# Altium footprint library EXPLORER.PcbLib: 252 footprints (part 13 of 16)
Each footprint in its own frame and in the unit in brackets; x right, y up, seen from the top. Pads: shape width x height; smd on the part's side, far side on the other; paste and mask are expansions set on the pad; w line width, h text height; cw(c..) or ccw(c..) is an arc to the next point about the centre after c.
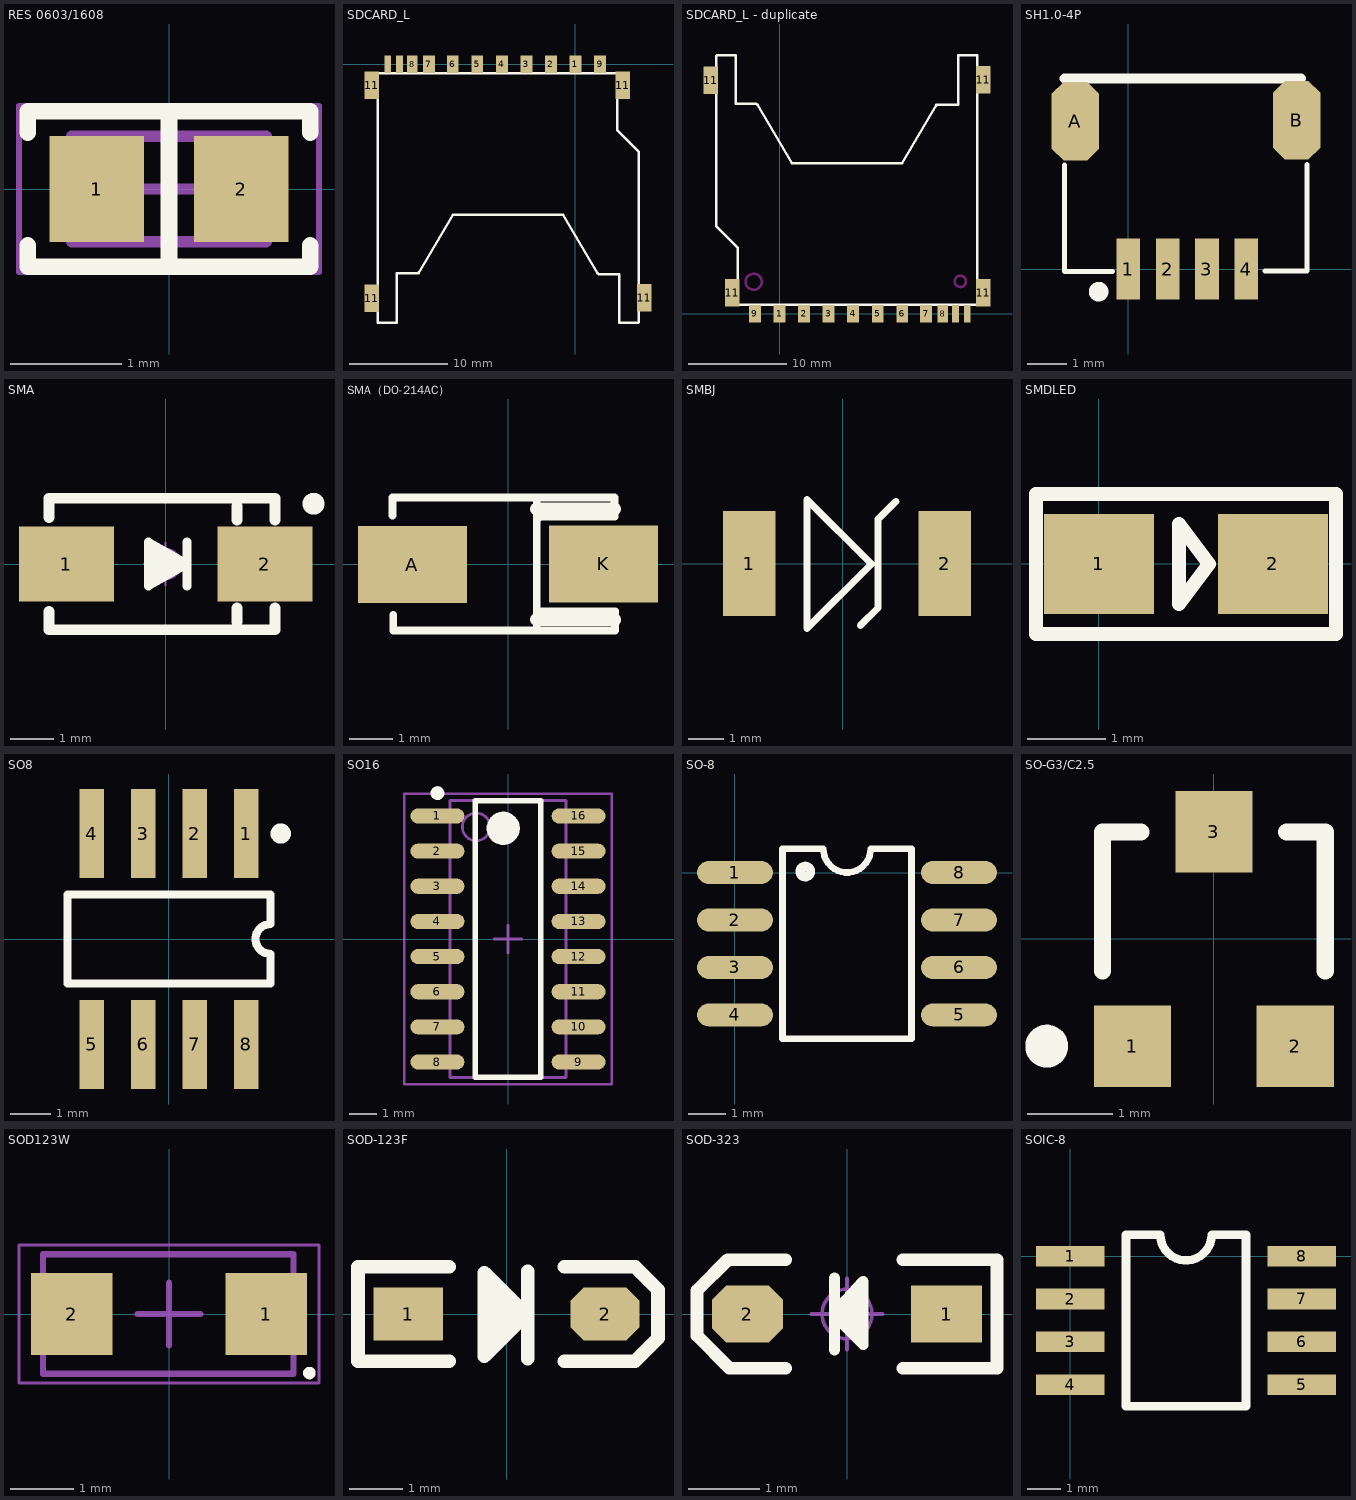
[diagram p12: the footprints below, top view; thin cyan lines are the x and y axes]

## RES 0603/1608 [mm]
pads (2):
  rect 0.85x0.95 smd: 1(-0.65,0) 2(0.65,0)
Top Overlay:
  lines w0.15: -1.27,-0.508 -1.27,-0.7 1.27,-0.7 1.27,-0.508 ; -1.27,0.508 -1.27,0.7 1.27,0.7 1.27,0.508 ; 0,-0.7 0,0.7
Mechanical 13:
  lines w0.1: -0.875,-0.475 0.875,-0.475 0.875,0.475 -0.875,0.475 -0.875,-0.475
Mechanical 15:
  lines w0.05: -1.35,-0.75 1.35,-0.75 1.35,0.75 -1.35,0.75 -1.35,-0.75
  lines w0.1: -0.475,0 0.475,0 ; 0,-0.475 0,0.475
3D body: height 0.45, standoff 0, extent -0.8,-0.4 0.8,0.4

## SDCARD_L [mm]
pads (15):
  rect 1.2x1.8 smd: 1(0,0) 2(-2.489,0) 3(-4.983,-0.009) 4(-7.483,-0.009) 5(-9.983,-0.009) 6(-12.483,-0.009) 7(-14.908,-0.009) 9(2.517,-0.009)
  rect 1.1x1.8 smd: 8(-16.612,0)
  rect 0.7x1.8 smd: 10(-17.908,-0.009) 12(-19.101,0)
  rect 1.5x2.8 smd: 11(-20.726,-23.834) 11(-20.726,-2.143) 11(4.826,-2.143) 11(7.01,-23.784)
Top Overlay:
  lines w0.254: -18.158,-21.3 -18.158,-26.3 -20.131,-26.3 -20.131,-0.914 -20.117,-0.9 4.242,-0.9 4.242,-6.71 6.431,-8.899 6.442,-8.899 6.442,-26.273 6.415,-26.3 4.442,-26.3 4.442,-21.402 2.4,-21.402 2.242,-21.244 ; -18.107,-21.294 -16.065,-21.294 -15.907,-21.136 ; -15.958,-21.294 -12.446,-15.3 ; -12.458,-15.3 -1.258,-15.3 2.242,-21.294

## SDCARD_L - duplicate [mm]
pads (15):
  rect 1.2x1.8 smd: 1(0,0) 2(2.489,0) 3(4.983,0.009) 4(7.483,0.009) 5(9.983,0.009) 6(12.483,0.009) 7(14.908,0.009) 9(-2.517,0.009)
  rect 1.1x1.8 smd: 8(16.612,0)
  rect 0.7x1.8 smd: 10(17.908,0.009) 12(19.101,0)
  rect 1.5x2.8 smd: 11(-7.01,23.784) 11(-4.826,2.143) 11(20.726,2.143) 11(20.726,23.834)
Top Overlay:
  lines w0.254: -2.242,21.244 -2.4,21.402 -4.442,21.402 -4.442,26.3 -6.415,26.3 -6.442,26.273 -6.442,8.899 -6.431,8.899 -4.242,6.71 -4.242,0.9 20.117,0.9 20.131,0.914 20.131,26.3 18.158,26.3 18.158,21.3 ; -2.242,21.294 1.258,15.3 12.458,15.3 ; 12.446,15.3 15.958,21.294 ; 15.907,21.136 16.065,21.294 18.107,21.294
Keep-Out Layer:
  circle w0.254: c-2.642,3.26 r0.82
  circle w0.254: c18.39,3.3 r0.58

## SH1.0-4P [mm]
pads (6):
  rect 0.6x1.55 smd: 1(0,0) 2(1,0) 3(2,0) 4(3,0)
  oct 1.2x2 smd: A(-1.346,3.759) B(4.279,3.785)
Top Overlay:
  circle w0.25: c-0.754,-0.573 r0.125
  lines w0.127: -1.626,2.653 -1.626,-0.065 -0.4,-0.065 ; 3.48,-0.051 4.547,-0.051 4.547,2.667
  lines w0.254: -1.626,4.851 4.394,4.851

## SMA [mm] "4.5x2.6*2.2mm（长宽高，不包括引脚）"
height 2.54
pads (2):
  rect 2.2x1.75 smd: 1(-2.3,0) 2(2.3,0)
Top Overlay:
  circle w0.254: c3.429,1.397 r0.127
  lines w0.203: 0.494,-0.508 0.494,0.508 ; -0.395,-0.508 -0.395,0.508 0.494,0 -0.395,-0.508
  lines w0.254: -2.7,-1.105 -2.7,-1.524 2.54,-1.524 2.54,-1.016 ; -2.7,1.08 -2.7,1.524 2.54,1.524 2.54,1.016 ; -0.33,0.305 0.305,0 -0.254,-0.305 -0.254,0.051 0.023,0 ; 1.651,-1.35 1.651,-1.016 ; 1.651,1.016 1.651,1.35
Mechanical 15:
  circle w0.05: c0,0 r0.35
  lines w0.05: -0.5,0 0.5,0 ; 0,-0.5 0,0.5
3D body: height 2.15, standoff 0.04, extent -2.528,-1.3 2.574,1.3

## SMA（DO-214AC） [mm] "贴"
height 2.3
pads (2):
  rect 2.5x1.778 smd: A(-2.193,-0.006) K(2.193,0.006)
Top Overlay:
  lines w0.178: -2.649,1.118 -2.649,1.53 2.447,1.53 2.447,1.118 ; -2.631,-1.161 -2.631,-1.518 2.454,-1.518 2.454,-1.105 ; 0.66,-1.493 0.66,1.524 ; 0.66,1.016 0.694,1.05 ; 0.694,-1.079 2.454,-1.079 ; 0.694,1.092 2.447,1.092
  lines w0.3: 0.66,-1.27 2.439,-1.27 2.447,-1.278 ; 0.66,1.27 2.439,1.27
3D body: height 2.4, standoff 0, extent -2.108,-1.499 2.489,1.524
3D body: height 1, standoff 0, extent 2.477,-0.483 2.997,0.508
3D body: height 1, standoff 0, extent -2.616,-0.508 -2.095,0.584
3D body: height 2.4, standoff 2.4, extent 1.549,-1.499 1.956,1.524

## SMBJ [mm]
pads (2):
  rect 1.5x3 smd: 1(-2.667,0) 2(2.921,0)
Top Overlay:
  lines w0.203: 0.508,-1.778 1.016,-1.27 1.016,1.27 1.524,1.778 ; -1.016,-1.854 -1.016,1.829 0.826,-0.013 -1.016,-1.854

## SMDLED [mm]
pads (2):
  rect 1.4x1.27 smd: 1(0.001,-0.002) 2(2.211,-0.002)
Top Overlay:
  lines w0.178: 3.012,0.887 3.011,0.887 ; 3.011,0.887 -0.799,0.887 -0.799,-0.002 -0.799,-0.891 3.011,-0.891 3.011,0.887 ; 1.017,-0.51 1.398,-0.002 1.017,0.506 1.017,-0.51

## SO8 [mm] "Small Outline; 8 Leads; Body Width 3.9 mm; Pitch 1.27 mm"
height 1.75
pads (8):
  rect 0.6x2.2 smd: 1(1.905,2.6) 2(0.635,2.6) 3(-0.635,2.6) 4(-1.905,2.6) 5(-1.905,-2.6) 6(-0.635,-2.6) 7(0.635,-2.6) 8(1.905,-2.6)
Top Overlay:
  circle w0.25: c2.755,2.6 r0.125
  lines w0.2: -2.5,-1.1 2.5,-1.1 2.5,-0.367 cw(c2.5,0) 2.5,0.367 2.5,1.1 -2.5,1.1 -2.5,-1.1

## SO16 [mm] "SOP, 16-Leads, Body 10.0x4.2mm (max), Pitch 1.27mm, IPC Medium Density"
height 2.65
pads (16):
  oval 1.95x0.55 smd: 1(-2.55,4.445) 2(-2.55,3.175) 3(-2.55,1.905) 4(-2.55,0.635) 5(-2.55,-0.635) 6(-2.55,-1.905) 7(-2.55,-3.175) 8(-2.55,-4.445) 9(2.55,-4.445) 10(2.55,-3.175) 11(2.55,-1.905) 12(2.55,-0.635) 13(2.55,0.635) 14(2.55,1.905) 15(2.55,3.175) 16(2.55,4.445)
Top Overlay:
  circle w0.6: c-0.175,4 r0.3
  circle w0.25: c-2.55,5.27 r0.125
  lines w0.2: -1.175,-5 1.175,-5 1.175,5 -1.175,5 -1.175,-5
Mechanical 13:
  circle w0.1: c-1.15,4.05 r0.5
  lines w0.1: -2.1,-5 2.1,-5 2.1,5 -2.1,5 -2.1,-5
Mechanical 15:
  lines w0.1: -0.5,0 0.5,0 ; 0,-0.5 0,0.5 ; -3.75,-5.25 3.75,-5.25 3.75,5.25 -3.75,5.25 -3.75,-5.25
3D body: height 2.65, standoff 0.1, extent -2.1,-5 2.1,5

## SO-8 [mil] "贴片"
height 60
pads (8):
  oval 80x24 smd: 1(0,0) 2(0,-50) 3(0,-100) 4(0,-150) 5(236,-150) 6(236,-100) 7(236,-50) 8(236,0)
Top Overlay:
  circle w10: c74,1 r5.39
  lines w7: 50,-175 50,25 93,25 ccw(c118,25) 143,25 186,25 186,-175 50,-175
3D body: height 50, standoff 0, extent 156.8,-158 196.2,7.08
3D body: height 50, standoff 0, extent 39.8,-157.08 79.2,8
3D body: height 69.84, standoff 30, extent 59.5,-177 176.51,-137.07
3D body: height 69.84, standoff 30, extent 59.49,-12.93 176.5,27
3D body: height 69.84, standoff 30, extent 39.63,-156.92 79.55,7.08
3D body: height 70, standoff 30, extent 39.62,-12.83 79.41,27
3D body: height 29.96, standoff 20, extent 204.76,-8 214.74,8
3D body: height 30, standoff 20, extent 196.2,-8 209.75,8
3D body: height 25, standoff 0, extent 204.7,-8 214.7,8
3D body: height 10, standoff 0, extent 209.75,-8 236,8
3D body: height 29.96, standoff 20, extent 204.76,-58 214.74,-42
3D body: height 30, standoff 20, extent 196.2,-58 209.75,-42
3D body: height 25, standoff 0, extent 204.7,-58 214.7,-42
3D body: height 10, standoff 0, extent 209.75,-58 236,-42
3D body: height 29.96, standoff 20, extent 204.76,-108 214.74,-92
3D body: height 30, standoff 20, extent 196.2,-108 209.75,-92
3D body: height 25, standoff 0, extent 204.7,-108 214.7,-92
3D body: height 10, standoff 0, extent 209.75,-108 236,-92
3D body: height 29.96, standoff 20, extent 204.76,-158 214.74,-142
3D body: height 30, standoff 20, extent 196.2,-158 209.75,-142
3D body: height 25, standoff 0, extent 204.7,-158 214.7,-142
3D body: height 10, standoff 0, extent 209.75,-158 236,-142
3D body: height 29.96, standoff 20, extent 21.26,-158 31.24,-142
3D body: height 30, standoff 20, extent 26.25,-158 39.8,-142
3D body: height 25, standoff 0, extent 21.3,-158 31.3,-142
3D body: height 10, standoff 0, extent 0,-158 26.25,-142
3D body: height 29.96, standoff 20, extent 21.26,-108 31.24,-92
3D body: height 30, standoff 20, extent 26.25,-108 39.8,-92
3D body: height 25, standoff 0, extent 21.3,-108 31.3,-92
3D body: height 10, standoff 0, extent 0,-108 26.25,-92
3D body: height 29.96, standoff 20, extent 21.26,-58 31.24,-42
3D body: height 30, standoff 20, extent 26.25,-58 39.8,-42
3D body: height 25, standoff 0, extent 21.3,-58 31.3,-42
3D body: height 10, standoff 0, extent 0,-58 26.25,-42
3D body: height 10, standoff 0, extent 0,-8 26.25,8
3D body: height 25, standoff 0, extent 21.3,-8 31.3,8
3D body: height 70.1, standoff 63.1, extent 54.38,-17.72 85.75,13.72
3D body: height 30, standoff 20, extent 26.25,-8 39.8,8
3D body: height 29.96, standoff 20, extent 21.26,-8 31.24,8
3D body: height 50, standoff 0, extent 39.57,-12.88 79.41,27.04
3D body: height 69.84, standoff 30, extent 156.45,-156.92 196.37,7.08
3D body: height 50, standoff 0, extent 39.41,-177.04 79.26,-137.12
3D body: height 70, standoff 30, extent 39.41,-177 79.2,-137.17
3D body: height 50, standoff 0, extent 156.74,-177.04 196.59,-137.12
3D body: height 70, standoff 30, extent 156.8,-177 196.59,-137.17
3D body: height 50, standoff 0, extent 156.59,-12.88 196.43,27.04
3D body: height 70, standoff 30, extent 156.59,-12.83 196.38,27
3D body: height 70, standoff 6, extent 59.41,-157.08 178,6
3D body: height 50, standoff 0, extent 59.41,-13.2 176.08,27
3D body: height 50, standoff 0, extent 59.92,-177 176.59,-136.8

## SO-G3/C2.5 [mm]
pads (3):
  rect 0.9x0.95 smd: 1(-0.95,-1.25) 2(0.95,-1.25) 3(0,1.25)
Top Overlay:
  circle w0.25: c-1.95,-1.25 r0.125
  lines w0.2: -1.3,-0.375 -1.3,1.25 -0.85,1.25 ; 0.85,1.25 1.3,1.25 1.3,-0.375

## SOD123W [mm] "SOD123W"
height 1.1
pads (2):
  rect 1.3x1.3 smd: 1(1.55,0) 2(-1.55,0)
Top Overlay:
  circle w0.1: c2.235,-0.94 r0.05
Mechanical 13:
  lines w0.1: -2.007,-0.95 1.981,-0.95 1.981,0.95 -2.007,0.95 -2.007,-0.95
Mechanical 15:
  lines w0.05: -2.388,-1.1 2.388,-1.1 2.388,1.1 -2.388,1.1 -2.388,-1.1
  lines w0.1: -0.5,0 0.5,0 ; 0,-0.5 0,0.5
3D body: height 1.1, standoff -0.01, extent -2,-0.95 2,0.95

## SOD-123F [mm] "2.7x1.6X1.1mm（长宽高，不包括引脚）"
pads (2):
  rect 1.3x1 smd: 1(-1.85,0)
  oct 1.3x1 smd: 2(1.85,0)
Top Overlay:
  lines w0.254: -1.079,-0.889 -2.794,-0.889 -2.794,0.889 -1.079,0.889 ; -0.254,0.559 -0.229,-0.432 0.254,0 0,0.254 0,0 0,-0.254 ; 0.356,-0.02 -0.417,-0.792 -0.417,0.775 0.396,-0.038 ; 0.396,-0.841 0.396,0.805 ; 1.079,-0.889 2.413,-0.889 2.845,-0.457 2.845,0.457 2.413,0.889 1.079,0.889
Mechanical 15:
  circle w0.05: c0,0 r0.35
  lines w0.05: -0.5,0 0.5,0 ; 0,-0.5 0,0.5
3D body: height 1.15, standoff 0.04, extent -1.9,-0.8 1.9,0.8

## SOD-323 [mm] "1.8x1.3X0.9mm（长宽高，不包括引脚）"
pads (2):
  rect 1x0.8 smd: 1(1.4,0)
  oct 1x0.8 smd: 2(-1.4,0)
Top Overlay:
  lines w0.152: -0.178,-0.508 -0.178,0.508 ; -0.178,-0.025 0.229,-0.432 0.229,0.457 -0.178,0.025
  lines w0.178: -0.864,-0.762 -1.651,-0.762 -2.108,-0.305 -2.108,0.33 -1.676,0.762 -0.864,0.762 ; 0.787,-0.762 2.108,-0.762 2.108,0.762 0.787,0.762
  lines w0.254: 0.025,-0.127 -0.025,0.025 0.152,0.178 0.127,-0.254
Mechanical 15:
  circle w0.05: c0,0 r0.35
  lines w0.05: -0.5,0 0.5,0 ; 0,-0.5 0,0.5
3D body: height 1, standoff 0.04, extent -1.311,-0.669 1.337,0.631

## SOIC-8 [mil]
pads (8):
  rect 80x24 smd: 1(0,0) 2(0,-50.06) 3(0,-100.06) 4(0,-150.06) 5(270,-150) 6(270,-100) 7(270,-50) 8(270,0)
Top Overlay:
  lines w10: 75,24.94 75.06,25 105,25 ccw(c135,25) 165,25 204.94,25 205,24.94 205,-175.06 65,-175.06 65,24.94 95,24.94